# Altium footprint library MH_DA_THU_VIEN_16122016.PcbLib: 531 footprints (part 19 of 34)
Each footprint in its own frame and in the unit in brackets; x right, y up, seen from the top. Pads: shape width x height; smd on the part's side, far side on the other; paste and mask are expansions set on the pad; w line width, h text height; cw(c..) or ccw(c..) is an arc to the next point about the centre after c.
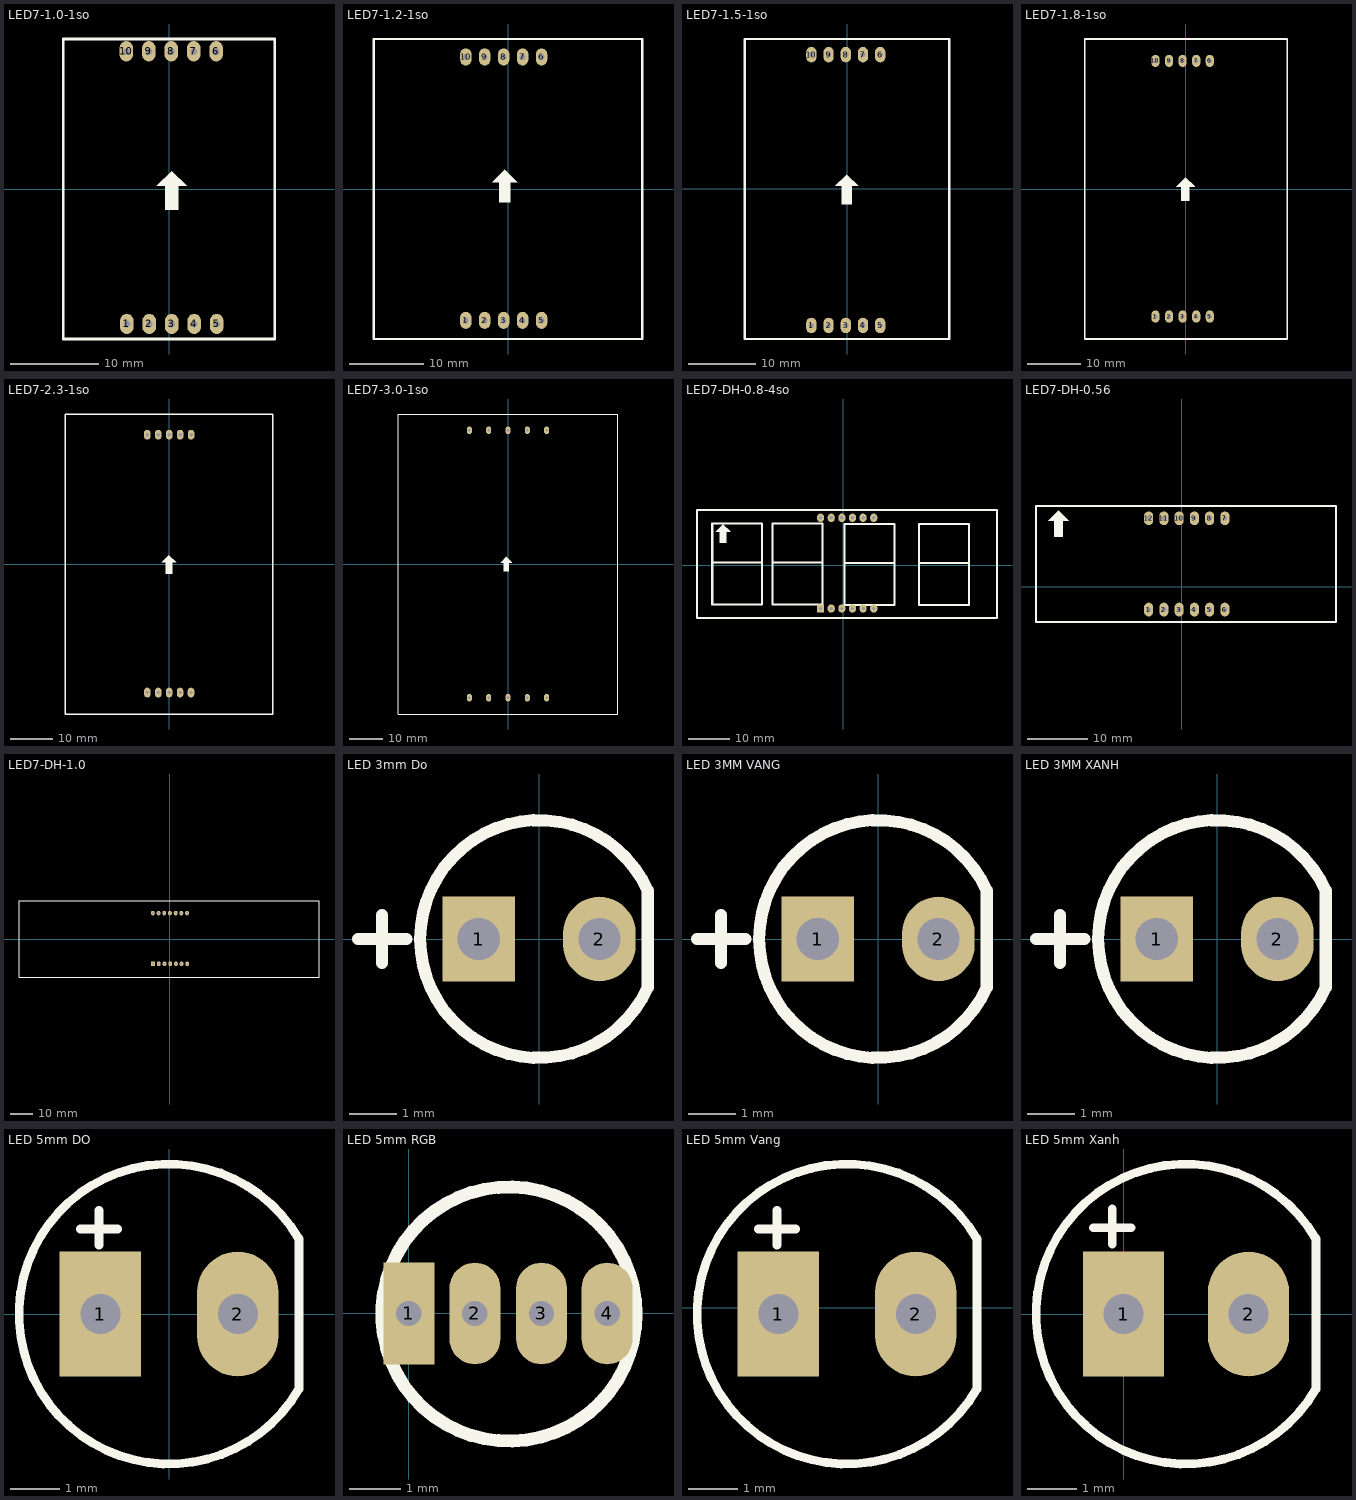
[diagram p18: the footprints below, top view; thin cyan lines are the x and y axes]

## LED7-1.0-1so [mil]
pads (10):
  oval 60x90 hole 31: 1(-189.76,-598.43) 2(-89.76,-598.43) 3(10.24,-598.43) 4(110.24,-598.43) 5(210.24,-598.43) 6(208.12,614.63) 7(108.12,614.63) 8(8.12,614.63) 9(-91.88,614.63) 10(-191.88,614.63)
Top Overlay:
  region: -56.63,15.75 9.37,81.75 11.37,81.75 76.37,16.75 76.37,15.75 39.37,15.75 39.37,-90.25 -19.63,-90.25 -19.63,15.75
  lines w11.81: -472.44,-665.35 468.5,-665.35 468.5,669.29 90.55,669.29 -472.44,669.29 -472.44,-311.02 -472.44,-665.35

## LED7-1.2-1so [mil]
pads (10):
  oval 60x90 hole 31: 1(-222.83,-692.91) 2(-122.83,-692.91) 3(-22.83,-692.91) 4(77.17,-692.91) 5(177.17,-692.91) 6(177.17,696.85) 7(77.17,696.85) 8(-22.83,696.85) 9(-122.83,696.85) 10(-222.83,696.85)
Top Overlay:
  region: -84.19,35.43 -18.19,101.43 -16.19,101.43 48.81,36.43 48.81,35.43 11.81,35.43 11.81,-70.57 -47.19,-70.57 -47.19,35.43
  lines w11.81: -287.4,-791.34 208.66,-791.34 708.66,-791.34 708.66,-55.12 708.66,692.91 708.66,791.34 -39.37,791.34 -708.66,791.34 -708.66,-791.34 -421.26,-791.34 -263.78,-791.34

## LED7-1.5-1so [mil]
pads (10):
  oval 60x90 hole 31: 1(-207.09,-795.28) 2(-107.09,-795.28) 3(-7.09,-795.28) 4(92.91,-795.28) 5(192.91,-795.28) 6(192.91,779.53) 7(92.91,779.53) 8(-7.09,779.53) 9(-107.09,779.53) 10(-207.09,779.53)
Top Overlay:
  region: -68.44,15.75 -2.44,81.75 -0.44,81.75 64.56,16.75 64.56,15.75 27.56,15.75 27.56,-90.25 -31.44,-90.25 -31.44,15.75
  lines w11.81: -594.49,-874.02 -594.49,870.08 594.49,870.08 594.49,-874.02 -594.49,-874.02

## LED7-1.8-1so [mil]
pads (10):
  oval 60x90 hole 31: 1(-222.83,-937.01) 2(-122.83,-937.01) 3(-22.83,-937.01) 4(77.17,-937.01) 5(177.17,-937.01) 6(177.17,944.88) 7(77.17,944.88) 8(-22.83,944.88) 9(-122.83,944.88) 10(-222.83,944.88)
Top Overlay:
  region: -68.44,19.69 -2.44,85.69 -0.44,85.69 64.56,20.69 64.56,19.69 27.56,19.69 27.56,-86.31 -31.44,-86.31 -31.44,19.69
  lines w11.81: -744.09,-1102.36 -744.09,1106.3 748.03,1106.3 748.03,-1102.36 -744.09,-1102.36
3D body: height 393.7, standoff -196.85, extent -748.03,-1094.48 748.04,1110.24

## LED7-2.3-1so [mil]
pads (10):
  oval 60x90 hole 31: 1(-199,-1181) 2(-98.75,-1181) 3(1.5,-1181) 4(101.75,-1181) 5(202,-1181) 6(203,1188) 7(102.25,1188) 8(1.5,1188) 9(-99.25,1188) 10(-200,1188)
Top Overlay:
  region: -68.44,15.75 -2.44,81.75 -0.44,81.75 64.56,16.75 64.56,15.75 27.56,15.75 27.56,-90.25 -31.44,-90.25 -31.44,15.75
  lines w11.81: -952.76,-1377.95 952.76,-1377.95 952.76,1377.95 -952.76,1377.95 -952.76,-1377.95
3D body: height 393.7, standoff -236.22, extent -944.88,-1374.01 944.89,1381.89

## LED7-3.0-1so [mil]
pads (10):
  oval 60x90 hole 31: 1(-456.69,-1578.74) 2(-228.35,-1578.74) 3(0,-1578.74) 4(228.35,-1578.74) 5(456.69,-1578.74) 6(456.69,1582.68) 7(228.35,1582.68) 8(0,1582.68) 9(-228.35,1582.68) 10(-456.69,1582.68)
Top Overlay:
  region: -88.13,19.69 -22.13,85.69 -20.13,85.69 44.87,20.69 44.87,19.69 7.87,19.69 7.87,-86.31 -51.13,-86.31 -51.13,19.69
  lines w11.81: -1299.21,-1771.65 1299.21,-1771.65 1299.21,1775.59 -1299.21,1775.59 -1299.21,-1771.65

## LED7-DH-0.8-4so [mm]
pads (12):
  rect 1.7x2 hole 0.8: 1(-5.429,-10.282)
  oval 1.7x2 hole 0.8: 2(-2.889,-10.282) 3(-0.349,-10.282) 4(2.191,-10.282) 5(4.731,-10.282) 6(7.271,-10.282) 7(7.271,11.384) 8(4.731,11.384) 9(2.191,11.384) 10(-0.349,11.384) 11(-2.889,11.384) 12(-5.429,11.384)
Top Overlay:
  region: -30.44,8.1 -28.763,9.776 -28.713,9.776 -27.062,8.125 -27.062,8.1 -28.001,8.1 -28.001,5.408 -29.5,5.408 -29.5,8.1
  lines w0.5: -31.3,0.7 -19.4,0.7 ; -16.9,0.7 -5,0.7 ; 0.3,0.6 12.2,0.6 ; 18.1,0.6 30,0.6 ; -34.944,-12.568 36.709,-12.568 36.709,13.264 -34.944,13.264 -34.944,-12.568 ; -31.3,-9.3 -19.4,-9.3 -19.4,10 -31.3,10 -31.3,-9.3 ; -16.9,-9.3 -5,-9.3 -5,10 -16.9,10 -16.9,-9.3 ; 0.3,-9.4 12.2,-9.4 12.2,9.9 0.3,9.9 0.3,-9.4 ; 18.1,-9.4 30,-9.4 30,9.9 18.1,9.9 18.1,-9.4
3D body: height 7.02, standoff -2.98, extent -6.7,10.03 8.54,12.57
3D body: height 7.02, standoff -2.98, extent -6.72,-11.67 8.52,-9.13

## LED7-DH-0.56 [mil]
pads (12):
  oval 60x90 hole 31: 1(-217.44,-148.27) 2(-117.44,-148.27) 3(-17.44,-148.27) 4(82.56,-148.27) 5(182.56,-148.27) 6(282.56,-148.27) 7(282.56,450.67) 8(182.56,450.67) 9(82.56,450.67) 10(-17.44,450.67) 11(-117.44,450.67) 12(-217.44,450.67)
Top Overlay:
  region: -875.58,434.89 -809.58,500.89 -807.58,500.89 -742.58,435.89 -742.58,434.89 -779.58,434.89 -779.58,328.89 -838.58,328.89 -838.58,434.89
  lines w11.81: -956.69,-229.33 1011.81,-229.33 1011.81,530.67 -956.69,530.67 -956.69,-229.33
3D body: height 511.81, standoff 35.43, extent -962.59,-224.4 1017.72,523.63
3D body: height 276.19, standoff -117.51, extent -272.44,400.67 327.56,500.67
3D body: height 276.19, standoff -117.51, extent -267.44,-203.27 332.56,-103.27

## LED7-DH-1.0 [mm]
pads (14):
  rect 1.7x2 hole 0.8: 1(-7.491,-10.982)
  oval 1.7x2 hole 0.8: 2(-4.951,-10.982) 3(-2.411,-10.982) 4(0.129,-10.982) 5(2.669,-10.982) 6(5.209,-10.982) 7(7.738,-11) 8(7.638,11.6) 9(5.1,11.6) 10(2.562,11.6) 11(0.024,11.6) 12(-2.515,11.6) 13(-5.053,11.6) 14(-7.591,11.6)
Top Overlay:
  lines w0.5: -67.2,-16.9 66.4,-16.9 66.4,17 -67.2,17 -67.2,-16.9

## LED 3mm Do [mil] "Footprintf LED phi 3"
pads (2):
  rect 60x70 hole 35: 1(-50,0)
  oval 60x70 hole 35: 2(50,0)
Top Overlay:
  lines w10: -150,0 -110,0 ; -130,-20 -130,20 ; 90,-40 cw(c0,0) 90,40 90,-40
3D body: height 205.32, standoff -117.51, extent -77.16,-78.45 60,78.47

## LED 3MM VANG [mil]
pads (2):
  rect 60x70 hole 35: 1(-50,0)
  oval 60x70 hole 35: 2(50,0)
Top Overlay:
  lines w10: -150,0 -140,0 -110,0 ; -130,-20 -130,20 ; 90,-40 cw(c0,0) 90,40 90,-40
3D body: height 205.33, standoff -117.51, extent -77.16,-78.45 60,78.47

## LED 3MM XANH [mil]
pads (2):
  rect 60x70 hole 35: 1(-50,0)
  oval 60x70 hole 35: 2(50,0)
Top Overlay:
  lines w10: -150,0 -110,0 -140,0 ; -130,-20 -130,20 ; 90,-40 cw(c0,0) 90,40 90,-40
3D body: height 205.33, standoff -117.51, extent -77.16,-78.46 60,78.46

## LED 5mm DO [mil] "LED 2 PIN, 5 ly , Only colour, pin to pin 110mil"
height 300
pads (2):
  rect 65x100 hole 32: 1(-55,0)
  oval 65x100 hole 32: 2(55,0)
Top Overlay:
  lines w7: -71,68 -41,68 ; -56,55 -56,83 ; 103.51,60.71 ccw(c0,0) 103.94,-59.97 ; 104,-59 104,60
3D body: height 339.18, standoff -243.49, extent -115.69,-117 97.7,120

## LED 5mm RGB [mm]
pads (4):
  rect 1x2 hole 0.5: 1(0,0)
  oval 1x2 hole 0.5: 2(1.3,0) 3(2.609,0) 4(3.9,0)
Top Overlay:
  circle w0.254: c1.97,-0.01 r2.5
3D body: height 9.7, standoff -3, extent -0.96,-2.87 4.44,2.928

## LED 5mm Vang [mil]
pads (2):
  rect 65x100 hole 32: 1(175,-5)
  oval 65x100 hole 32: 2(285,-5)
Top Overlay:
  lines w7: 159,63 189,63 ; 174,50 174,78 ; 333.51,55.71 ccw(c230,-5) 333.94,-64.97 ; 334,-64 334,55
3D body: height 339.75, standoff -242.93, extent 113.31,-125 326.7,111.99

## LED 5mm Xanh [mil] "LED 2 PIN, 5 ly , Only colour,pin to pin 100mil"
height 300
pads (2):
  rect 65x100 hole 32: 1(0,0)
  oval 65x100 hole 32: 2(100,0)
Top Overlay:
  lines w7: -24,69 6,69 ; -9,56 -9,84 ; 153.51,60.71 ccw(c50,0) 153.94,-59.97 ; 154,-59 154,60
3D body: height 336.82, standoff -117.51, extent -54.33,-103.65 154.33,105.01